# Altium footprint library AltiumLibrary.PcbLib: 127 footprints (part 7 of 8)
Each footprint in its own frame and in the unit in brackets; x right, y up, seen from the top. Pads: shape width x height; smd on the part's side, far side on the other; paste and mask are expansions set on the pad; w line width, h text height; cw(c..) or ccw(c..) is an arc to the next point about the centre after c.
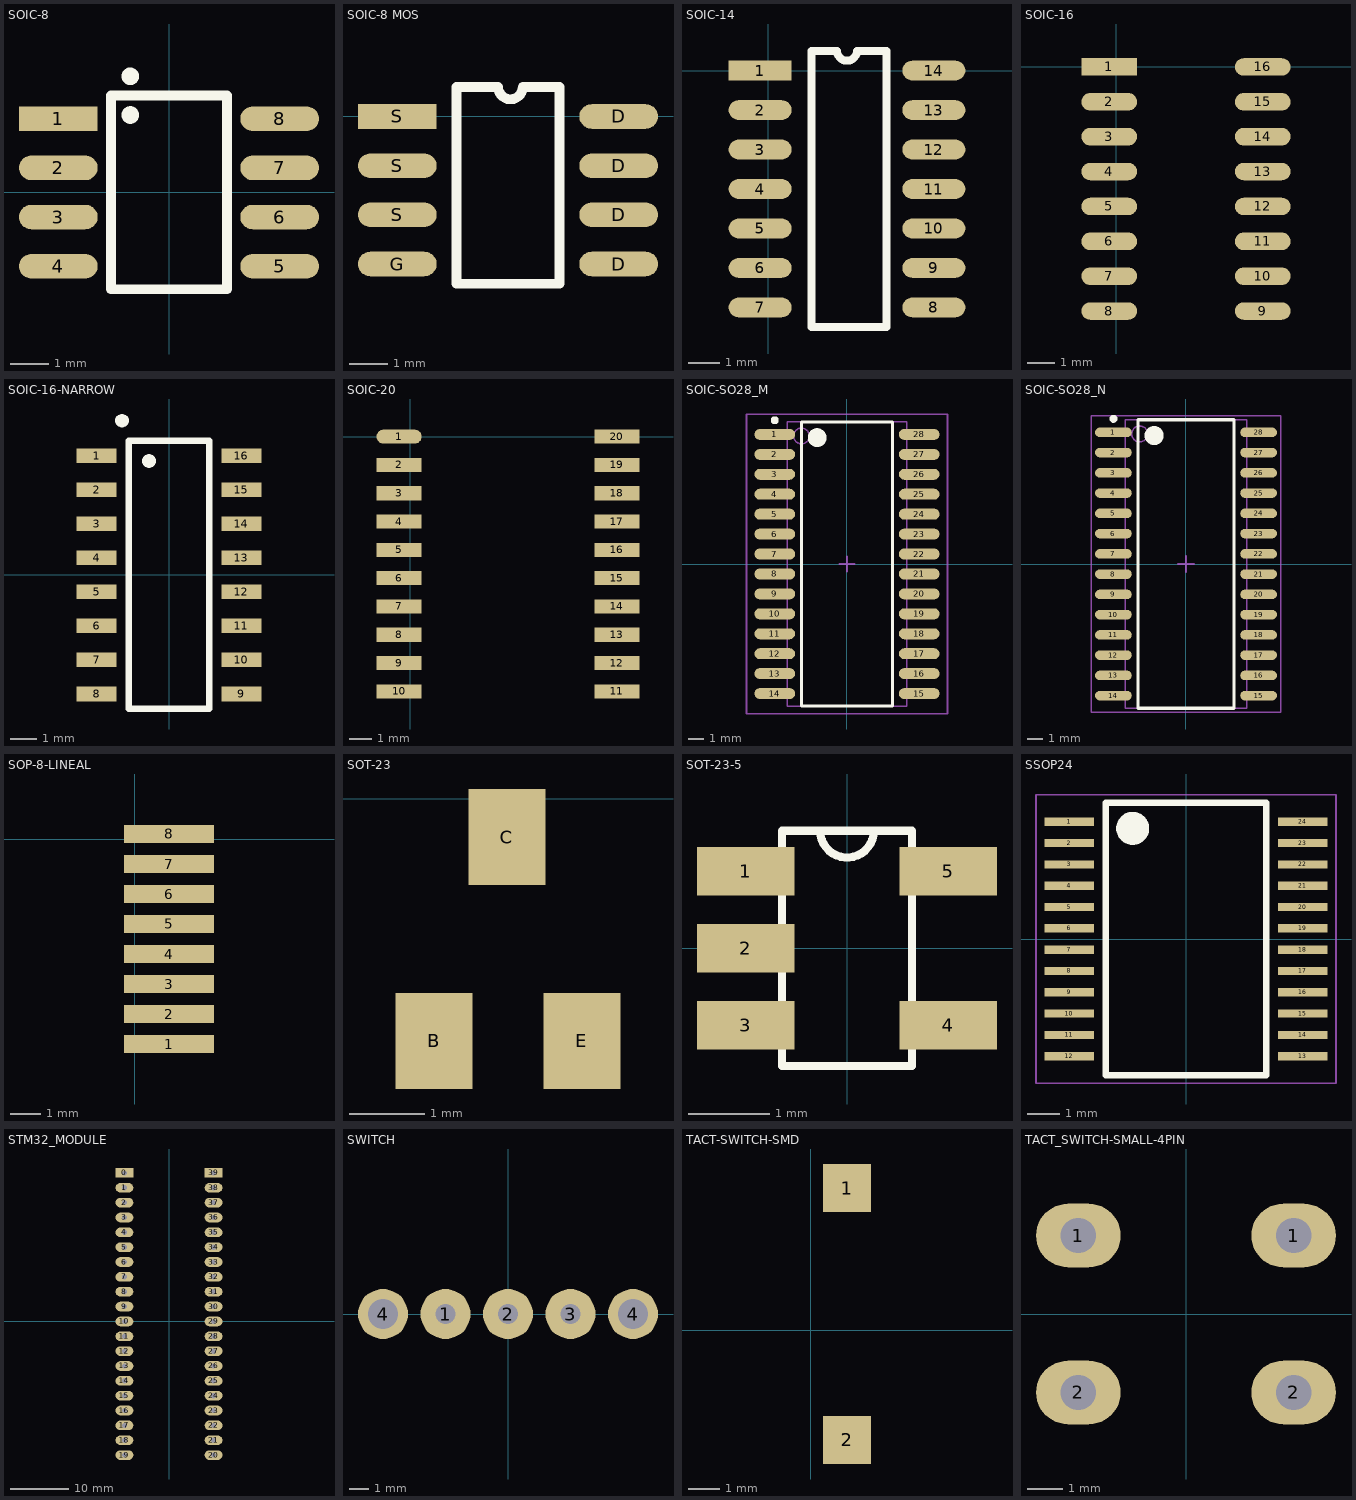
[diagram p6: the footprints below, top view; thin cyan lines are the x and y axes]

## SOIC-8 [mil]
pads (8):
  rect 80x25 smd: 1(-112.5,75)
  oval 80x25 smd: 2(-112.5,25) 3(-112.5,-25) 4(-112.5,-75) 5(112.5,-75) 6(112.5,-25) 7(112.5,25) 8(112.5,75)
Top Overlay:
  circle w10: c-39.37,118.11 r3.94
  circle w10: c-39.37,78.74 r3.94
  lines w10: -59.06,-98.43 59.06,-98.43 59.06,98.43 -59.06,98.43 -59.06,-98.43
3D body "User Library-SOIC-8-1.step": height 68.9, standoff 0, extent -118.1,-96.46 118.11,96.46

## SOIC-8 MOS [mil]
pads (8):
  oval 80x25 smd: D(440,-150) D(440,-100) D(440,-50) D(440,0) G(215,-150) S(215,-100) S(215,-50)
  rect 80x25 smd: S(215,0)
Top Overlay:
  lines w10: 275,-170 380,-170 380,30 342.5,30 cw(c330,30) 317.5,30 275,30 275,-170
3D body "User Library-SOIC-8-1.step": height 68.9, standoff 0, extent 211.9,-171.46 448.12,21.46

## SOIC-14 [mil]
pads (14):
  rect 80x25 smd: 1(-10,0)
  oval 80x25 smd: 2(-10,-50) 3(-10,-100) 4(-10,-150) 5(-10,-200) 6(-10,-250) 7(-10,-300) 8(210,-300) 9(210,-250) 10(210,-200) 11(210,-150) 12(210,-100) 13(210,-50) 14(210,0)
Top Overlay:
  lines w10: 55,-325 150,-325 150,25 112.5,25 cw(c100,25) 87.5,25 55,25 55,-325
3D body "User Library-SOIC14-150.step": height 68.9, standoff 0, extent -19.16,-318.31 209.18,18.31

## SOIC-16 [mil]
pads (16):
  rect 80x25 smd: 1(-10,0)
  oval 80x25 smd: 2(-10,-50) 3(-10,-100) 4(-10,-150) 5(-10,-200) 6(-10,-250) 7(-10,-300) 8(-10,-350) 9(210,-350) 10(210,-300) 11(210,-250) 12(210,-200) 13(210,-150) 14(210,-100) 15(210,-50) 16(210,0)
3D body "User Library-SOIC-16-1.step": height 55.12, standoff 0, extent -18.1,-369.88 218.12,19.89

## SOIC-16-NARROW [mm]
pads (16):
  rect 1.5x0.55 smd: 1(-2.7,4.445) 2(-2.7,3.175) 3(-2.7,1.905) 4(-2.7,0.635) 5(-2.7,-0.635) 6(-2.7,-1.905) 7(-2.7,-3.175) 8(-2.7,-4.445) 9(2.7,-4.445) 10(2.7,-3.175) 11(2.7,-1.905) 12(2.7,-0.635) 13(2.7,0.635) 14(2.7,1.905) 15(2.7,3.175) 16(2.7,4.445)
Top Overlay:
  region: -0.75,4 -0.8,4 -0.892,4.038 -0.962,4.108 -1,4.2 -1,4.25 -1,4.3 -0.962,4.392 -0.892,4.462 -0.8,4.5 -0.75,4.5 -0.7,4.5 -0.608,4.462 -0.538,4.392 -0.5,4.3 -0.5,4.25 -0.5,4.2 -0.538,4.108 -0.608,4.038 -0.7,4
  region: -1.75,5.5 -1.8,5.5 -1.892,5.538 -1.962,5.608 -2,5.7 -2,5.75 -2,5.8 -1.962,5.892 -1.892,5.962 -1.8,6 -1.75,6 -1.7,6 -1.608,5.962 -1.538,5.892 -1.5,5.8 -1.5,5.75 -1.5,5.7 -1.538,5.608 -1.608,5.538 -1.7,5.5
  lines w0.254: -1.5,-5 -1.5,5 1.5,5 1.5,-5 -1.5,-5
3D body "SOIC16 narrow.stp": height 2, standoff 0, extent -3.081,-5.04 3.082,5.04

## SOIC-20 [mil]
pads (20):
  oval 80x25 smd: 1(-20,0)
  rect 80x25 smd: 2(-20,-50) 3(-20,-100) 4(-20,-150) 5(-20,-200) 6(-20,-250) 7(-20,-300) 8(-20,-350) 9(-20,-400) 10(-20,-450) 11(365,-450) 12(365,-400) 13(365,-350) 14(365,-300) 15(365,-250) 16(365,-200) 17(365,-150) 18(365,-100) 19(365,-50) 20(365,0)
3D body "User Library-SOIC20-300.step": height 106.33, standoff 2, extent -30.51,-475 375,28.94

## SOIC-SO28_M [mm] "SOIC, 28-Leads, Body 17.9x7.5mm, Pitch 1.27mm, IPC Low Density"
height 2.65
pads (28):
  oval 2.6x0.7 smd: 1(-4.6,8.255) 2(-4.6,6.985) 3(-4.6,5.715) 4(-4.6,4.445) 5(-4.6,3.175) 6(-4.6,1.905) 7(-4.6,0.635) 8(-4.6,-0.635) 9(-4.6,-1.905) 10(-4.6,-3.175) 11(-4.6,-4.445) 12(-4.6,-5.715) 13(-4.6,-6.985) 14(-4.6,-8.255) 15(4.6,-8.255) 16(4.6,-6.985) 17(4.6,-5.715) 18(4.6,-4.445) 19(4.6,-3.175) 20(4.6,-1.905) 21(4.6,-0.635) 22(4.6,0.635) 23(4.6,1.905) 24(4.6,3.175) 25(4.6,4.445) 26(4.6,5.715) 27(4.6,6.985) 28(4.6,8.255)
Top Overlay:
  circle w0.25: c-4.6,9.155 r0.125
  circle w0.6: c-1.9,8.05 r0.3
  lines w0.2: -2.9,-9.05 -2.9,9.05 2.9,9.05 2.9,-9.05 -2.9,-9.05
Mechanical 13:
  circle w0.1: c-2.9,8.155 r0.5
  lines w0.1: -3.8,-9.055 -3.8,9.055 3.8,9.055 3.8,-9.055 -3.8,-9.055
Mechanical 15:
  lines w0.1: -0.5,0 0.5,0 ; 0,-0.5 0,0.5 ; -6.4,-9.55 -6.4,9.55 6.4,9.55 6.4,-9.55 -6.4,-9.55
3D body: height 2.65, standoff 0, extent -3.8,-9.055 3.8,9.055

## SOIC-SO28_N [mm] "SOIC, 28-Leads, Body 17.9x7.5mm, Pitch 1.27mm, IPC Medium Density"
height 2.65
pads (28):
  oval 2.3x0.6 smd: 1(-4.55,8.255) 2(-4.55,6.985) 3(-4.55,5.715) 4(-4.55,4.445) 5(-4.55,3.175) 6(-4.55,1.905) 7(-4.55,0.635) 8(-4.55,-0.635) 9(-4.55,-1.905) 10(-4.55,-3.175) 11(-4.55,-4.445) 12(-4.55,-5.715) 13(-4.55,-6.985) 14(-4.55,-8.255) 15(4.55,-8.255) 16(4.55,-6.985) 17(4.55,-5.715) 18(4.55,-4.445) 19(4.55,-3.175) 20(4.55,-1.905) 21(4.55,-0.635) 22(4.55,0.635) 23(4.55,1.905) 24(4.55,3.175) 25(4.55,4.445) 26(4.55,5.715) 27(4.55,6.985) 28(4.55,8.255)
Top Overlay:
  circle w0.6: c-2,8.05 r0.3
  circle w0.25: c-4.55,9.105 r0.125
  lines w0.2: -3,-9.05 3,-9.05 3,9.05 -3,9.05 -3,-9.05
Mechanical 13:
  circle w0.1: c-2.9,8.155 r0.5
  lines w0.1: -3.8,-9.055 3.8,-9.055 3.8,9.055 -3.8,9.055 -3.8,-9.055
Mechanical 15:
  lines w0.1: -0.5,0 0.5,0 ; 0,-0.5 0,0.5 ; -5.95,-9.3 5.95,-9.3 5.95,9.3 -5.95,9.3 -5.95,-9.3
3D body: height 2.65, standoff 0, extent -3.8,-9.055 3.8,9.055

## SOP-8-LINEAL [mm]
pads (8):
  rect 3x0.6 all layers, no hole: 1(1.143,-6.826) 2(1.143,-5.826) 3(1.143,-4.826) 4(1.143,-3.826) 5(1.143,-2.826) 6(1.143,-1.826) 7(1.143,-0.826) 8(1.143,0.174)
3D body "SW3dPS-TFDU4101.STEP": height 4.33, standoff 0.03, extent -0.389,-8.23 4.928,1.676

## SOT-23 [mil]
pads (3):
  rect 40x50 smd: B(237.2,-125.98) C(275,-20) E(313.98,-125.98)
3D body "User Library-3-lead sot23-3.step": height 37.59, standoff -2.57, extent 218.11,-124.01 333.08,-26.53

## SOT-23-5 [mm]
pads (5):
  rect 1.2x0.6 smd: 1(-1.25,0.95) 2(-1.25,0) 3(-1.25,-0.95) 4(1.25,-0.95) 5(1.25,0.95)
Top Overlay:
  lines w0.1: -0.8,-1.45 0.8,-1.45 0.8,1.45 -0.8,1.45 -0.8,-1.45
  lines w0.102: -0.33,1.45 ccw(c0,1.45) 0.33,1.45
3D body "LP2985AIM5-3.6_NOPB.stp": height 1.45, standoff 0, extent -1.4,-1.45 1.4,1.45

## SSOP24 [mm]
pads (24):
  rect 1.5x0.25 smd: 1(-3.562,3.575) 2(-3.562,2.925) 3(-3.562,2.275) 4(-3.562,1.625) 5(-3.562,0.975) 6(-3.562,0.325) 7(-3.562,-0.325) 8(-3.562,-0.975) 9(-3.562,-1.625) 10(-3.562,-2.275) 11(-3.562,-2.925) 12(-3.562,-3.575) 13(3.562,-3.575) 14(3.562,-2.925) 15(3.562,-2.275) 16(3.562,-1.625) 17(3.562,-0.975) 18(3.562,-0.325) 19(3.562,0.325) 20(3.562,0.975) 21(3.562,1.625) 22(3.562,2.275) 23(3.562,2.925) 24(3.562,3.575)
Top Overlay:
  circle w0.508: c-1.625,3.375 r0.25
  lines w0.2: -2.45,-4.15 -2.45,4.15 2.45,4.15 2.45,-4.15 -2.45,-4.15
Mechanical 20:
  lines w0.05: -4.575,-4.4 -4.575,4.4 4.575,4.4 4.575,-4.4 -4.575,-4.4
3D body "TB6612FNG,C,8,EL.stp": height 1.6, standoff 0, extent -3.8,-4.15 3.8,4.15

## STM32_MODULE [mil]
pads (40):
  rect 120x65 hole 35.43: 0(-300,1000) 39(300,1000)
  oval 120x65 hole 35.43: 1(-300,900) 2(-300,800) 3(-300,700) 4(-300,600) 5(-300,500) 6(-300,400) 7(-300,300) 8(-300,200) 9(-300,100) 10(-300,0) 11(-300,-100) 12(-300,-200) 13(-300,-300) 14(-300,-400) 15(-300,-500) 16(-300,-600) 17(-300,-700) 18(-300,-800) 19(-300,-900) 20(300,-900) 21(300,-800) 22(300,-700) 23(300,-600) 24(300,-500) 25(300,-400) 26(300,-300) 27(300,-200) 28(300,-100) 29(300,0) 30(300,100) 31(300,200) 32(300,300) 33(300,400) 34(300,500) 35(300,600) 36(300,700) 37(300,800) 38(300,900)
Top Overlay:
  region: -200,700
3D body "STM32F103 - blue pill.step": height 637.71, standoff -81.58, extent -450,-1136.14 450,1130
3D body: height 10, standoff -1131.58, extent -125,725 -125,725

## SWITCH [mm]
pads (5):
  round 2.54 hole 1: 1(-3.175,0) 2(0,0) 3(3.175,0)
  round 2.54 hole 1.5: 4(-6.35,0) 4(6.35,0)
3D body "User Library-SLB12814.STEP": height 9.65, standoff -2.6, extent -7,-3.1 7,3.1

## TACT-SWITCH-SMD [mil]
pads (2):
  rect 60x60 smd: 1(45,177.49) 2(45,-137.48)
3D body "User Library-Tact switch 1181_3.step": height 94.49, standoff -3.94, extent -25.86,-137.48 115.87,177.49

## TACT_SWITCH-SMALL-4PIN [mm]
pads (4):
  oval 2.4x1.8 hole 1: 1(-3.048,2.222) 1(3.048,2.222) 2(-3.048,-2.222) 2(3.048,-2.222)
3D body "User Library-TPxxxx (Switch).STEP": height 5.15, standoff -3.34, extent -3.989,-3 3.989,3